# Altium footprint library SAMTEC SMD.PcbLib: 165 footprints (part 13 of 17)
Each footprint in its own frame and in the unit in brackets; x right, y up, seen from the top. Pads: shape width x height; smd on the part's side, far side on the other; paste and mask are expansions set on the pad; w line width, h text height; cw(c..) or ccw(c..) is an arc to the next point about the centre after c.
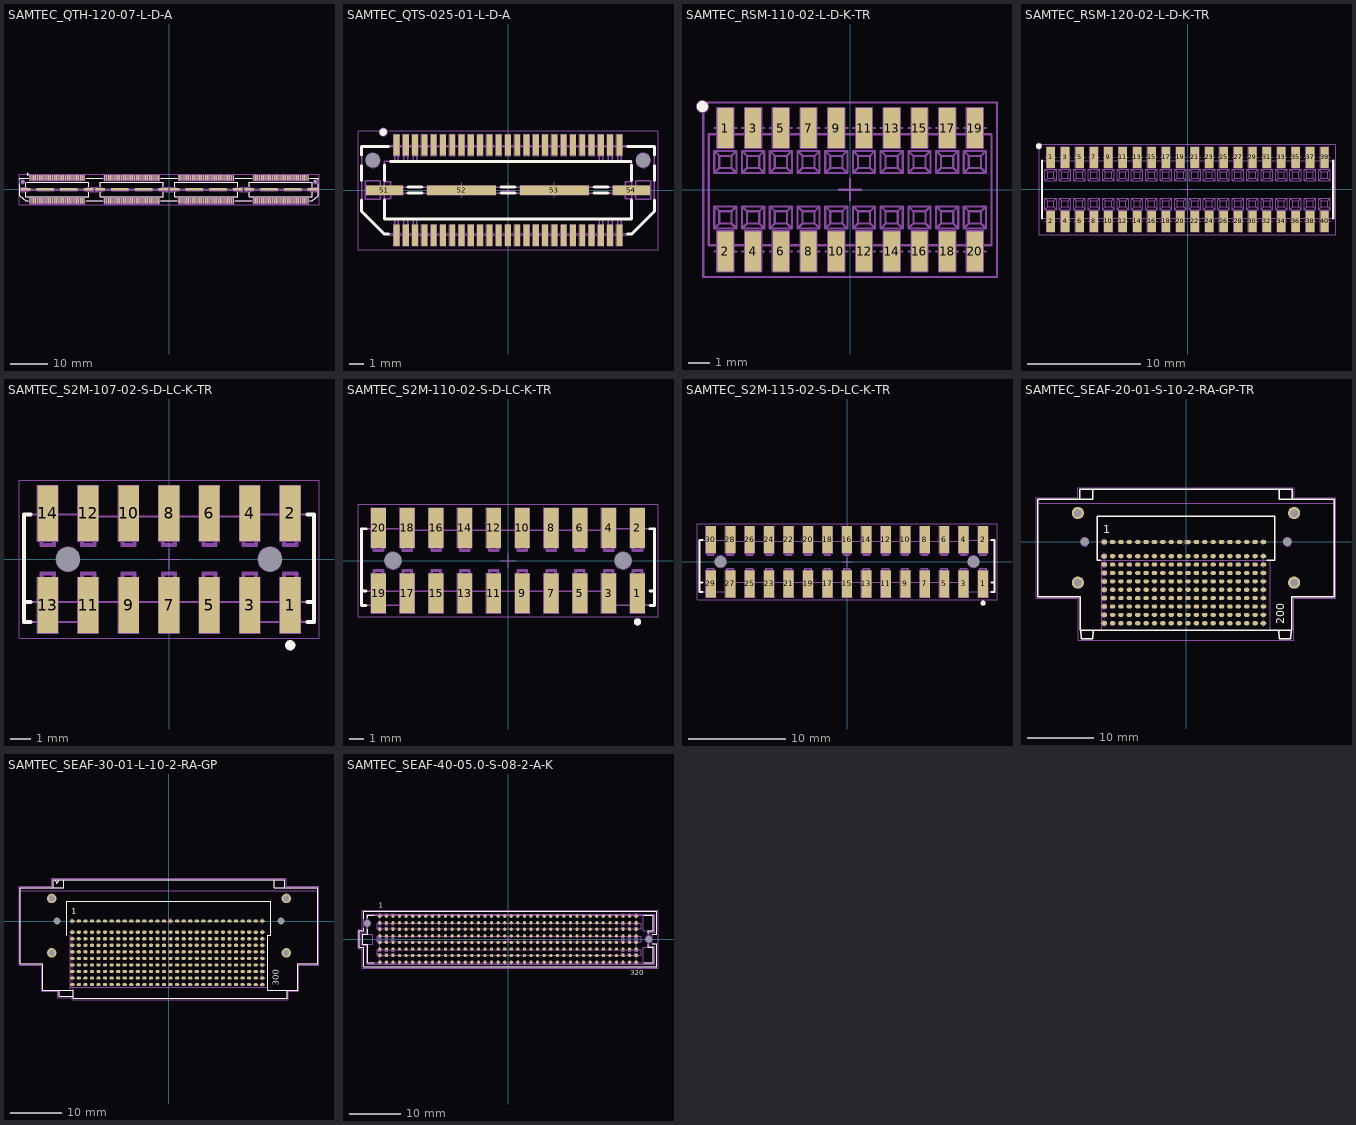
[diagram p12: the footprints below, top view; thin cyan lines are the x and y axes]

## SAMTEC_QTH-120-07-L-D-A [mm] "240  (4x60) Contacts, Pitch 0.5mm, Straight Double Row High Speed Ground Plane Header (Lead Style 24.24mm)"
height 24.24
pads (258):
  rect 0.305x1.45 smd mask+0: 1(-37.255,3.086) 2(-37.255,-3.086) 3(-36.755,3.086) 4(-36.755,-3.086) 5(-36.255,3.086) 6(-36.255,-3.086) 7(-35.755,3.086) 8(-35.755,-3.086) 9(-35.255,3.086) 10(-35.255,-3.086) 11(-34.755,3.086) 12(-34.755,-3.086) 13(-34.255,3.086) 14(-34.255,-3.086) 15(-33.755,3.086) 16(-33.755,-3.086) 17(-33.255,3.086) 18(-33.255,-3.086) 19(-32.755,3.086) 20(-32.755,-3.086) 21(-32.255,3.086) 22(-32.255,-3.086) 23(-31.755,3.086) 24(-31.755,-3.086) 25(-31.255,3.086) 26(-31.255,-3.086) 27(-30.755,3.086) 28(-30.755,-3.086) 29(-30.255,3.086) 30(-30.255,-3.086) 31(-29.755,3.086) 32(-29.755,-3.086) 33(-29.255,3.086) 34(-29.255,-3.086) 35(-28.755,3.086) 36(-28.755,-3.086) 37(-28.255,3.086) 38(-28.255,-3.086) 39(-27.755,3.086) 40(-27.755,-3.086) 41(-27.255,3.086) 42(-27.255,-3.086) 43(-26.755,3.086) 44(-26.755,-3.086) 45(-26.255,3.086) 46(-26.255,-3.086) 47(-25.755,3.086) 48(-25.755,-3.086) 49(-25.255,3.086) 50(-25.255,-3.086) 51(-24.755,3.086) 52(-24.755,-3.086) 53(-24.255,3.086) 54(-24.255,-3.086) 55(-23.755,3.086) 56(-23.755,-3.086) 57(-23.255,3.086) 58(-23.255,-3.086) 59(-22.755,3.086) 60(-22.755,-3.086) 61(-17.252,3.086) 62(-17.252,-3.086) 63(-16.752,3.086) 64(-16.752,-3.086) 65(-16.252,3.086) 66(-16.252,-3.086) 67(-15.752,3.086) 68(-15.752,-3.086) 69(-15.252,3.086) 70(-15.252,-3.086) 71(-14.752,3.086) 72(-14.752,-3.086) 73(-14.252,3.086) 74(-14.252,-3.086) 75(-13.752,3.086) 76(-13.752,-3.086) 77(-13.252,3.086) 78(-13.252,-3.086) 79(-12.752,3.086) 80(-12.752,-3.086) 81(-12.252,3.086) 82(-12.252,-3.086) 83(-11.752,3.086) 84(-11.752,-3.086) 85(-11.252,3.086) 86(-11.252,-3.086) 87(-10.752,3.086) 88(-10.752,-3.086) 89(-10.252,3.086) 90(-10.252,-3.086) 91(-9.752,3.086) 92(-9.752,-3.086) 93(-9.252,3.086) 94(-9.252,-3.086) 95(-8.752,3.086) 96(-8.752,-3.086) 97(-8.252,3.086) 98(-8.252,-3.086) 99(-7.752,3.086) 100(-7.752,-3.086) 101(-7.252,3.086) 102(-7.252,-3.086) 103(-6.752,3.086) 104(-6.752,-3.086) 105(-6.252,3.086) 106(-6.252,-3.086) 107(-5.752,3.086) 108(-5.752,-3.086) 109(-5.252,3.086) 110(-5.252,-3.086) 111(-4.752,3.086) 112(-4.752,-3.086) 113(-4.252,3.086) 114(-4.252,-3.086) 115(-3.752,3.086) 116(-3.752,-3.086) 117(-3.252,3.086) 118(-3.252,-3.086) 119(-2.752,3.086) 120(-2.752,-3.086) 121(2.752,3.086) 122(2.752,-3.086) 123(3.251,3.086) 124(3.251,-3.086) 125(3.751,3.086) 126(3.751,-3.086) 127(4.252,3.086) 128(4.252,-3.086) 129(4.751,3.086) 130(4.751,-3.086) 131(5.252,3.086) 132(5.252,-3.086) 133(5.751,3.086) 134(5.751,-3.086) 135(6.251,3.086) 136(6.251,-3.086) 137(6.752,3.086) 138(6.752,-3.086) 139(7.251,3.086) 140(7.251,-3.086) 141(7.752,3.086) 142(7.752,-3.086) 143(8.251,3.086) 144(8.251,-3.086) 145(8.751,3.086) 146(8.751,-3.086) 147(9.252,3.086) 148(9.252,-3.086) 149(9.751,3.086) 150(9.751,-3.086) 151(10.252,3.086) 152(10.252,-3.086) 153(10.751,3.086) 154(10.751,-3.086) 155(11.251,3.086) 156(11.251,-3.086) 157(11.752,3.086) 158(11.752,-3.086) 159(12.251,3.086) 160(12.251,-3.086) 161(12.751,3.086) 162(12.751,-3.086) 163(13.252,3.086) 164(13.252,-3.086) 165(13.751,3.086) 166(13.751,-3.086) 167(14.252,3.086) 168(14.252,-3.086) 169(14.751,3.086) 170(14.751,-3.086) 171(15.251,3.086) 172(15.251,-3.086) 173(15.752,3.086) 174(15.752,-3.086) 175(16.251,3.086) 176(16.251,-3.086) 177(16.751,3.086) 178(16.751,-3.086) 179(17.252,3.086) 180(17.252,-3.086) 181(22.755,3.086) 182(22.755,-3.086) 183(23.255,3.086) 184(23.255,-3.086) 185(23.755,3.086) 186(23.755,-3.086) 187(24.255,3.086) 188(24.255,-3.086) 189(24.755,3.086) 190(24.755,-3.086) 191(25.255,3.086) 192(25.255,-3.086) 193(25.755,3.086) 194(25.755,-3.086) 195(26.255,3.086) 196(26.255,-3.086) 197(26.755,3.086) 198(26.755,-3.086) 199(27.255,3.086) 200(27.255,-3.086) 201(27.755,3.086) 202(27.755,-3.086) 203(28.255,3.086) 204(28.255,-3.086) 205(28.755,3.086) 206(28.755,-3.086) 207(29.255,3.086) 208(29.255,-3.086) 209(29.755,3.086) 210(29.755,-3.086) 211(30.255,3.086) 212(30.255,-3.086) 213(30.755,3.086) 214(30.755,-3.086) 215(31.255,3.086) 216(31.255,-3.086) 217(31.755,3.086) 218(31.755,-3.086) 219(32.255,3.086) 220(32.255,-3.086) 221(32.755,3.086) 222(32.755,-3.086) 223(33.255,3.086) 224(33.255,-3.086) 225(33.755,3.086) 226(33.755,-3.086) 227(34.255,3.086) 228(34.255,-3.086) 229(34.755,3.086) 230(34.755,-3.086) 231(35.255,3.086) 232(35.255,-3.086) 233(35.755,3.086) 234(35.755,-3.086) 235(36.255,3.086) 236(36.255,-3.086) 237(36.755,3.086) 238(36.755,-3.086) 239(37.255,3.086) 240(37.255,-3.086)
  rect 2.54x0.64 smd mask+0: 241(-38.45,0) 244(-21.56,0) 245(-18.447,0) 248(-1.557,0) 249(1.557,0) 252(18.447,0) 253(21.56,0) 256(38.45,0)
  rect 4.7x0.64 smd mask+0: 242(-33.18,0) 243(-26.83,0) 246(-13.177,0) 247(-6.827,0) 250(6.827,0) 251(13.177,0) 254(26.83,0) 255(33.18,0)
  round 0.5 hole 1 unplated mask+0.25: 257(-39.245,2.032) 258(39.245,2.032)
Top Overlay:
  circle w0.25: c-37.897,4.047 r0.125
  lines w0.2: -39.977,1.509 -39.977,-1.639 -38.454,-2.982 -37.807,-2.982 ; -39.977,2.555 -39.977,2.982 -37.807,2.982 ; -38.424,-0.72 -38.424,-1.967 -21.543,-1.967 -21.543,-0.72 ; -38.424,0.72 -38.424,1.664 ; -38.347,1.967 -21.543,1.967 -21.543,0.72 ; -22.202,-2.982 -17.804,-2.982 ; -22.202,2.982 -17.804,2.982 ; -18.437,-0.72 -18.437,-1.967 -1.556,-1.967 -1.556,-0.72 ; -18.437,0.72 -18.437,1.967 -1.556,1.967 -1.556,0.72 ; -2.199,-2.982 2.199,-2.982 ; -2.199,2.982 2.199,2.982 ; 1.551,-0.72 1.551,-1.967 18.431,-1.967 18.431,-0.72 ; 1.551,0.72 1.551,1.967 18.431,1.967 18.431,0.72 ; 17.804,-2.982 22.202,-2.982 ; 17.804,2.982 22.202,2.982 ; 21.538,-0.72 21.538,-1.967 38.419,-1.967 38.419,-0.72 ; 21.538,0.72 21.538,1.967 38.347,1.967 ; 37.807,-2.982 38.449,-2.982 39.972,-1.639 39.972,1.502 ; 37.807,2.982 39.972,2.982 39.972,2.562 ; 38.419,0.72 38.419,1.675
Mechanical 8:
  drawing of 1550 lines, arcs and shapes, not listed
Mechanical 14:
  circle w0.1: c-37.895,4.047 r0.25
  lines w0.1: -38.708,-0.19 -39.438,-0.19 -39.438,0.19 -38.708,0.19 ; -38.424,-0.571 -38.008,-0.571 -38.008,-0.193 -38.159,-0.193 -38.159,0.193 -38.008,0.193 -38.008,0.571 -38.424,0.571 ; -21.543,-0.571 -21.959,-0.571 -21.959,-0.193 -21.808,-0.193 -21.808,0.193 -21.959,0.193 -21.959,0.571 -21.543,0.571 ; -21.069,-0.19 -20.529,-0.19 -20.529,0.19 -21.069,0.19 ; -18.911,-0.19 -19.451,-0.19 -19.451,0.19 -18.911,0.19 ; -18.437,-0.571 -18.02,-0.571 -18.02,-0.193 -18.171,-0.193 -18.171,0.193 -18.02,0.193 -18.02,0.571 -18.437,0.571 ; -1.556,-0.571 -1.972,-0.571 -1.972,-0.193 -1.821,-0.193 -1.821,0.193 -1.972,0.193 -1.972,0.571 -1.556,0.571 ; -1.081,-0.19 -0.542,-0.19 -0.542,0.19 -1.081,0.19 ; 1.076,-0.19 0.537,-0.19 0.537,0.19 1.076,0.19 ; 1.551,-0.571 1.967,-0.571 1.967,-0.193 1.816,-0.193 1.816,0.193 1.967,0.193 1.967,0.571 1.551,0.571 ; 18.431,-0.571 18.015,-0.571 18.015,-0.193 18.166,-0.193 18.166,0.193 18.015,0.193 18.015,0.571 18.431,0.571 ; 18.906,-0.19 19.445,-0.19 19.445,0.19 18.906,0.19 ; 21.063,-0.19 20.524,-0.19 20.524,0.19 21.063,0.19 ; 21.538,-0.571 21.954,-0.571 21.954,-0.193 21.803,-0.193 21.803,0.193 21.954,0.193 21.954,0.571 21.538,0.571 ; 38.419,-0.571 38.003,-0.571 38.003,-0.193 38.154,-0.193 38.154,0.193 38.003,0.193 38.003,0.571 38.419,0.571 ; 38.703,-0.19 39.433,-0.19 39.433,0.19 38.703,0.19 ; -39.977,-1.639 -38.454,-2.982 38.449,-2.982 39.972,-1.639 39.972,2.982 -39.977,2.982 -39.977,-1.639 ; -39.723,-0.635 -38.708,-0.635 -38.708,0.631 -39.723,0.631 -39.723,-0.635 ; -38.424,-1.967 -21.543,-1.967 -21.543,1.967 -38.424,1.967 -38.424,-1.967 ; -38.156,-0.19 -21.811,-0.19 -21.811,0.19 -38.156,0.19 -38.156,-0.19 ; -21.069,-0.635 -18.911,-0.635 -18.911,0.635 -21.069,0.635 -21.069,-0.635 ; -18.437,-1.967 -1.556,-1.967 -1.556,1.967 -18.437,1.967 -18.437,-1.967 ; -18.169,-0.19 -1.824,-0.19 -1.824,0.19 -18.169,0.19 -18.169,-0.19 ; -1.081,-0.635 1.076,-0.635 1.076,0.635 -1.081,0.635 -1.081,-0.635 ; 1.551,-1.967 18.431,-1.967 18.431,1.967 1.551,1.967 1.551,-1.967 ; 1.819,-0.19 18.164,-0.19 18.164,0.19 1.819,0.19 1.819,-0.19 ; 18.906,-0.635 18.906,0.635 21.063,0.635 21.063,-0.635 18.906,-0.635 ; 21.538,-1.967 38.419,-1.967 38.419,1.967 21.538,1.967 21.538,-1.967 ; 21.806,-0.19 38.151,-0.19 38.151,0.19 21.806,0.19 21.806,-0.19 ; 38.703,-0.635 39.718,-0.635 39.718,0.635 38.703,0.635 38.703,-0.635
Mechanical 15:
  lines w0.05: -40.227,-4.061 -40.227,4.061 40.222,4.061 40.222,-4.061 -40.227,-4.061
3D body "SAMTEC_QTH-120-07-L-D-A.stp": height 24.24, standoff -0.73, extent -39.977,-3.553 39.972,3.554

## SAMTEC_QTS-025-01-L-D-A [mm] "50 Contacts Female, Pitch 0.635mm, Straight Double Row High Speed Ground Plane Header"
height 4.27
pads (56):
  rect 0.4x1.45 smd mask+0: 1(-7.62,3.086) 2(-7.62,-3.086) 3(-6.985,3.086) 4(-6.985,-3.086) 5(-6.35,3.086) 6(-6.35,-3.086) 7(-5.715,3.086) 8(-5.715,-3.086) 9(-5.08,3.086) 10(-5.08,-3.086) 11(-4.445,3.086) 12(-4.445,-3.086) 13(-3.81,3.086) 14(-3.81,-3.086) 15(-3.175,3.086) 16(-3.175,-3.086) 17(-2.54,3.086) 18(-2.54,-3.086) 19(-1.905,3.086) 20(-1.905,-3.086) 21(-1.27,3.086) 22(-1.27,-3.086) 23(-0.635,3.086) 24(-0.635,-3.086) 25(0,3.086) 26(0,-3.086) 27(0.635,3.086) 28(0.635,-3.086) 29(1.27,3.086) 30(1.27,-3.086) 31(1.905,3.086) 32(1.905,-3.086) 33(2.54,3.086) 34(2.54,-3.086) 35(3.175,3.086) 36(3.175,-3.086) 37(3.81,3.086) 38(3.81,-3.086) 39(4.445,3.086) 40(4.445,-3.086) 41(5.08,3.086) 42(5.08,-3.086) 43(5.715,3.086) 44(5.715,-3.086) 45(6.35,3.086) 46(6.35,-3.086) 47(6.985,3.086) 48(6.985,-3.086) 49(7.62,3.086) 50(7.62,-3.086)
  rect 2.54x0.64 smd mask+0: 51(-8.446,0) 54(8.445,0)
  rect 4.7x0.64 smd mask+0: 52(-3.175,0) 53(3.175,0)
  round 0.5 hole 1 unplated mask+0.25: 55(-9.24,2.036) 56(9.24,2.036)
Top Overlay:
  circle w0.25: c-8.539,3.969 r0.125
  lines w0.2: -10.008,-0.667 -10.008,-1.46 -8.484,-2.984 -8.173,-2.984 ; -10.008,0.667 -10.008,1.669 ; -10.008,2.395 -10.008,2.984 -8.173,2.984 ; -8.446,-0.667 -8.446,-1.968 8.445,-1.968 8.445,-0.667 ; -8.446,0.667 -8.446,1.727 ; -8.041,1.968 8.392,1.954 ; -6.826,-0.203 -5.875,-0.203 ; -6.826,0.203 -5.875,0.203 ; -0.476,-0.203 0.475,-0.203 ; -0.476,0.203 0.475,0.203 ; 5.874,-0.203 6.826,-0.203 ; 5.874,0.203 6.826,0.203 ; 8.173,-2.984 8.483,-2.984 10.007,-1.46 10.007,-0.667 ; 8.173,2.984 10.007,2.984 10.007,2.395 ; 8.445,0.667 8.445,1.727 ; 10.007,0.667 10.007,1.669
Mechanical 8:
  drawing of 444 lines, arcs and shapes, not listed
Mechanical 14:
  circle w0.1: c-8.537,3.969 r0.25
  lines w0.1: -8.738,-0.191 -9.462,-0.191 -9.462,0.19 -8.738,0.19 ; -8.446,-0.572 -8.029,-0.572 -8.029,-0.203 ; -8.446,0.571 -8.029,0.571 -8.029,0.203 ; -7.747,-1.969 -7.747,-2.4 -7.493,-2.4 -7.493,-1.969 ; -7.747,1.968 -7.747,2.4 -7.493,2.4 -7.493,1.968 ; -7.722,-2.985 -7.722,-3.556 -7.519,-3.556 -7.519,-2.985 ; -7.722,2.984 -7.722,3.556 -7.519,3.556 -7.519,2.984 ; -7.112,-1.969 -7.112,-2.4 -6.858,-2.4 -6.858,-1.969 ; -7.112,1.968 -7.112,2.4 -6.858,2.4 -6.858,1.968 ; -7.087,-2.985 -7.087,-3.556 -6.884,-3.556 -6.884,-2.985 ; -7.087,2.984 -7.087,3.556 -6.884,3.556 -6.884,2.984 ; -6.477,-1.969 -6.477,-2.4 -6.223,-2.4 -6.223,-1.969 ; -6.477,1.968 -6.477,2.4 -6.223,2.4 -6.223,1.968 ; 6.223,-1.969 6.223,-2.4 6.477,-2.4 6.477,-1.969 ; 6.223,1.968 6.223,2.4 6.477,2.4 6.477,1.968 ; 6.858,-1.969 6.858,-2.4 7.112,-2.4 7.112,-1.969 ; 6.858,1.968 6.858,2.4 7.112,2.4 7.112,1.968 ; 6.883,-2.985 6.883,-3.556 7.086,-3.556 7.086,-2.985 ; 6.883,2.984 6.883,3.556 7.086,3.556 7.086,2.984 ; 7.493,-1.969 7.493,-2.4 7.747,-2.4 7.747,-1.969 ; 7.493,1.968 7.493,2.4 7.747,2.4 7.747,1.968 ; 7.518,-2.985 7.518,-3.556 7.721,-3.556 7.721,-2.985 ; 7.518,2.984 7.518,3.556 7.721,3.556 7.721,2.984 ; 8.029,-0.203 8.029,-0.572 8.445,-0.572 ; 8.445,0.571 8.029,0.571 8.029,0.203 ; 8.737,-0.191 9.461,-0.191 9.461,0.19 8.737,0.19 ; -8.029,0.203 8.029,0.203 ; -8.029,0.203 -8.156,0.203 -8.156,-0.203 8.156,-0.203 8.156,0.203 8.029,0.203 ; -10.008,-1.461 -8.484,-2.985 8.483,-2.985 10.007,-1.461 10.007,2.984 -10.008,2.984 -10.008,-1.461 ; -9.754,-0.635 -9.754,0.635 -8.738,0.635 -8.738,-0.635 -9.754,-0.635 ; -8.446,-1.969 8.445,-1.969 8.445,1.968 -8.446,1.968 -8.446,-1.969 ; 8.737,-0.635 8.737,0.635 9.753,0.635 9.753,-0.635 8.737,-0.635
Mechanical 15:
  lines w0.05: -10.258,-4.06 -8.073,-4.06 8.073,-4.06 10.257,-4.06 10.257,4.06 8.073,4.06 -8.073,4.06 -10.258,4.06 -10.258,-4.06
3D body "SAMTEC_QTS-025-01-L-D-A.stp": height 4.27, standoff -0.75, extent -10.008,-3.556 10.007,3.556

## SAMTEC_RSM-110-02-L-D-K-TR [mm] "20 Contacts - Pitch 1.27mm - Dual Row Straight SMD Micro Socket"
height 6.1
pads (20):
  rect 0.74x1.84 smd: 1(-5.715,2.825) 2(-5.715,-2.825) 3(-4.445,2.825) 4(-4.445,-2.825) 5(-3.175,2.825) 6(-3.175,-2.825) 7(-1.905,2.825) 8(-1.905,-2.825) 9(-0.635,2.825) 10(-0.635,-2.825) 11(0.635,2.825) 12(0.635,-2.825) 13(1.905,2.825) 14(1.905,-2.825) 15(3.175,2.825) 16(3.175,-2.825) 17(4.445,2.825) 18(4.445,-2.825) 19(5.715,2.825) 20(5.715,-2.825)
Top Overlay:
  circle w0.25: c-6.767,3.811 r0.125
  circle w0.25: c-6.767,3.811 r0.125
Mechanical 8:
  drawing of 214 lines, arcs and shapes, not listed
Mechanical 14:
  drawing of 245 lines, arcs and shapes, not listed
Mechanical 15:
  lines w0.1: -6.727,-3.995 -6.727,3.995 6.727,3.995 6.727,-3.995 -6.727,-3.995
3D body "SAMTEC_RSM-110-02-L-D-K-TR.stp": height 6.07, standoff 0, extent -6.477,-3.232 6.477,3.232

## SAMTEC_RSM-120-02-L-D-K-TR [mm] "40 Contacts - Pitch 1.27mm - Dual Row Straight SMD Micro Socket"
height 6.1
pads (40):
  rect 0.74x1.84 smd: 1(-12.065,2.825) 2(-12.065,-2.825) 3(-10.795,2.825) 4(-10.795,-2.825) 5(-9.525,2.825) 6(-9.525,-2.825) 7(-8.255,2.825) 8(-8.255,-2.825) 9(-6.985,2.825) 10(-6.985,-2.825) 11(-5.715,2.825) 12(-5.715,-2.825) 13(-4.445,2.825) 14(-4.445,-2.825) 15(-3.175,2.825) 16(-3.175,-2.825) 17(-1.905,2.825) 18(-1.905,-2.825) 19(-0.635,2.825) 20(-0.635,-2.825) 21(0.635,2.825) 22(0.635,-2.825) 23(1.905,2.825) 24(1.905,-2.825) 25(3.175,2.825) 26(3.175,-2.825) 27(4.445,2.825) 28(4.445,-2.825) 29(5.715,2.825) 30(5.715,-2.825) 31(6.985,2.825) 32(6.985,-2.825) 33(8.255,2.825) 34(8.255,-2.825) 35(9.525,2.825) 36(9.525,-2.825) 37(10.795,2.825) 38(10.795,-2.825) 39(12.065,2.825) 40(12.065,-2.825)
Top Overlay:
  circle w0.25: c-13.117,3.811 r0.125
  circle w0.25: c-13.117,3.811 r0.125
  lines w0.2: -12.827,-2.54 -12.827,2.54 ; 12.827,-2.54 12.827,2.54
Mechanical 8:
  drawing of 324 lines, arcs and shapes, not listed
Mechanical 14:
  drawing of 485 lines, arcs and shapes, not listed
Mechanical 15:
  lines w0.05: -13.077,-3.995 13.077,-3.995 13.077,3.995 -13.077,3.995 -13.077,-3.995
3D body "SAMTEC_RSM-120-02-L-D-K-TR.stp": height 6.07, standoff 0, extent -12.827,-3.232 12.827,3.232

## SAMTEC_S2M-107-02-S-D-LC-K-TR [mm] "14 Contacts, Pitch 2mm, Dual Row Surface Mount Tiger Eye High-reliability Cable Socket"
height 4.65
pads (16):
  rect 1.02x2.77 smd: 1(6,-2.275) 2(6,2.275) 3(4,-2.275) 4(4,2.275) 5(2,-2.275) 6(2,2.275) 7(0,-2.275) 8(0,2.275) 9(-2,-2.275) 10(-2,2.275) 11(-4,-2.275) 12(-4,2.275) 13(-6,-2.275) 14(-6,2.275)
  round 0.5 hole 1.2 unplated mask+0.35: MEC1(-5,0) MEC2(5,0)
Top Overlay:
  circle w0.25: c6,-4.26 r0.125
  lines w0.2: -7.175,-2.125 -6.86,-2.125 ; -6.86,-3.115 -7.175,-3.115 -7.175,2.215 -6.86,2.215 ; 6.86,-3.115 7.175,-3.115 7.175,2.215 6.86,2.215 ; 6.86,-2.125 7.175,-2.125
Mechanical 8:
  circle w0.05: c-5,0 r0.6
  circle w0.05: c5,0 r0.6
  lines w0.05: -5.5,0 -5,0 ; -5,-0.5 -5,0 ; -5,0.5 -5,0 ; -4.5,0 -5,0 ; -0.5,0 0,0 ; 0,-0.5 0,0 ; 0,0.5 0,0 ; 0.5,0 0,0 ; 4.5,0 5,0 ; 5,-0.5 5,0 ; 5,0.5 5,0 ; 5.5,0 5,0 ; -6.51,-3.66 -6.51,-0.89 -5.49,-0.89 -5.49,-3.66 ; -6.51,-3.66 -5.49,-3.66 ; -6.51,-3.66 -6,-2.275 -5.49,-3.66 ; -6.51,3.66 -5.49,3.66 ; -6.51,3.66 -6.51,0.89 -5.49,0.89 -5.49,3.66 ; -6.51,3.66 -6,2.275 -5.49,3.66 ; -4.51,-3.66 -4.51,-0.89 -3.49,-0.89 -3.49,-3.66 ; -4.51,-3.66 -3.49,-3.66 ; -4.51,-3.66 -4,-2.275 -3.49,-3.66 ; -4.51,3.66 -4.51,0.89 -3.49,0.89 -3.49,3.66 ; -4.51,3.66 -3.49,3.66 ; -4.51,3.66 -4,2.275 -3.49,3.66 ; -2.51,-3.66 -2.51,-0.89 -1.49,-0.89 -1.49,-3.66 ; -2.51,-3.66 -1.49,-3.66 ; -2.51,-3.66 -2,-2.275 -1.49,-3.66 ; -2.51,3.66 -2.51,0.89 -1.49,0.89 -1.49,3.66 ; -2.51,3.66 -1.49,3.66 ; -2.51,3.66 -2,2.275 -1.49,3.66 ; -0.51,-3.66 -0.51,-0.89 0.51,-0.89 0.51,-3.66 ; -0.51,-3.66 0.51,-3.66 ; -0.51,-3.66 0,-2.275 0.51,-3.66 ; -0.51,3.66 -0.51,0.89 0.51,0.89 0.51,3.66 ; -0.51,3.66 0.51,3.66 ; -0.51,3.66 0,2.275 0.51,3.66 ; 1.49,-3.66 1.49,-0.89 2.51,-0.89 2.51,-3.66 ; 1.49,-3.66 2.51,-3.66 ; 1.49,-3.66 2,-2.275 2.51,-3.66 ; 1.49,3.66 1.49,0.89 2.51,0.89 2.51,3.66 ; 1.49,3.66 2.51,3.66 ; 1.49,3.66 2,2.275 2.51,3.66 ; 3.49,-3.66 3.49,-0.89 4.51,-0.89 4.51,-3.66 ; 3.49,-3.66 4.51,-3.66 ; 3.49,-3.66 4,-2.275 4.51,-3.66 ; 3.49,3.66 3.49,0.89 4.51,0.89 4.51,3.66 ; 3.49,3.66 4.51,3.66 ; 3.49,3.66 4,2.275 4.51,3.66 ; 5.49,-3.66 5.49,-0.89 6.51,-0.89 6.51,-3.66 ; 5.49,-3.66 6.51,-3.66 ; 5.49,-3.66 6,-2.275 6.51,-3.66 ; 5.49,3.66 5.49,0.89 6.51,0.89 6.51,3.66 ; 5.49,3.66 6.51,3.66 ; 5.49,3.66 6,2.275 6.51,3.66
Mechanical 14:
  drawing of 171 lines, arcs and shapes, not listed
Mechanical 15:
  lines w0.05: -7.425,-3.91 7.425,-3.91 7.425,3.91 -7.425,3.91 -7.425,-3.91
3D body "SAMTEC_S2M-107-02-S-D-LC-K-TR.stp": height 4.65, standoff -1.39, extent -7.175,-3.15 7.175,3.15

## SAMTEC_S2M-110-02-S-D-LC-K-TR [mm] "20 Contacts, Pitch 2mm, Dual Row Surface Mount Tiger Eye High-reliability Cable Socket"
height 4.65
pads (22):
  rect 1.02x2.77 smd: 1(9,-2.275) 2(9,2.275) 3(7,-2.275) 4(7,2.275) 5(5,-2.275) 6(5,2.275) 7(3,-2.275) 8(3,2.275) 9(1,-2.275) 10(1,2.275) 11(-1,-2.275) 12(-1,2.275) 13(-3,-2.275) 14(-3,2.275) 15(-5,-2.275) 16(-5,2.275) 17(-7,-2.275) 18(-7,2.275) 19(-9,-2.275) 20(-9,2.275)
  round 0.5 hole 1.2 unplated mask+0.35: MEC1(-8,0) MEC2(8,0)
Top Overlay:
  circle w0.25: c9,-4.26 r0.125
  lines w0.2: -10.175,-2.125 -9.86,-2.125 ; -9.86,-3.115 -10.175,-3.115 -10.175,2.215 -9.86,2.215 ; 9.86,-3.115 10.175,-3.115 10.175,2.215 9.86,2.215 ; 9.86,-2.125 10.175,-2.125
Mechanical 8:
  circle w0.05: c8,0 r0.6
  circle w0.05: c-8,0 r0.6
  lines w0.05: -8.5,0 -8,0 ; -8,-0.5 -8,0 ; -8,0.5 -8,0 ; -7.5,0 -8,0 ; -0.5,0 0,0 ; 0,-0.5 0,0 ; 0,0.5 0,0 ; 0.5,0 0,0 ; 7.5,0 8,0 ; 8,-0.5 8,0 ; 8,0.5 8,0 ; 8.5,0 8,0 ; -9.51,-3.66 -9,-2.275 -8.49,-3.66 ; -9.51,-3.66 -8.49,-3.66 ; -9.51,-3.66 -9.51,-0.89 -8.49,-0.89 -8.49,-3.66 ; -9.51,3.66 -9,2.275 -8.49,3.66 ; -9.51,3.66 -9.51,0.89 -8.49,0.89 -8.49,3.66 ; -9.51,3.66 -8.49,3.66 ; -7.51,-3.66 -7,-2.275 -6.49,-3.66 ; -7.51,-3.66 -6.49,-3.66 ; -7.51,-3.66 -7.51,-0.89 -6.49,-0.89 -6.49,-3.66 ; -7.51,3.66 -7,2.275 -6.49,3.66 ; -7.51,3.66 -6.49,3.66 ; -7.51,3.66 -7.51,0.89 -6.49,0.89 -6.49,3.66 ; -5.51,-3.66 -5,-2.275 -4.49,-3.66 ; -5.51,-3.66 -4.49,-3.66 ; -5.51,-3.66 -5.51,-0.89 -4.49,-0.89 -4.49,-3.66 ; -5.51,3.66 -5,2.275 -4.49,3.66 ; -5.51,3.66 -4.49,3.66 ; -5.51,3.66 -5.51,0.89 -4.49,0.89 -4.49,3.66 ; -3.51,-3.66 -3,-2.275 -2.49,-3.66 ; -3.51,-3.66 -2.49,-3.66 ; -3.51,-3.66 -3.51,-0.89 -2.49,-0.89 -2.49,-3.66 ; -3.51,3.66 -3,2.275 -2.49,3.66 ; -3.51,3.66 -2.49,3.66 ; -3.51,3.66 -3.51,0.89 -2.49,0.89 -2.49,3.66 ; -1.51,-3.66 -1,-2.275 -0.49,-3.66 ; -1.51,-3.66 -0.49,-3.66 ; -1.51,-3.66 -1.51,-0.89 -0.49,-0.89 -0.49,-3.66 ; -1.51,3.66 -1,2.275 -0.49,3.66 ; -1.51,3.66 -0.49,3.66 ; -1.51,3.66 -1.51,0.89 -0.49,0.89 -0.49,3.66 ; 0.49,-3.66 1,-2.275 1.51,-3.66 ; 0.49,-3.66 0.49,-0.89 1.51,-0.89 1.51,-3.66 ; 0.49,-3.66 1.51,-3.66 ; 0.49,3.66 1,2.275 1.51,3.66 ; 0.49,3.66 0.49,0.89 1.51,0.89 1.51,3.66 ; 0.49,3.66 1.51,3.66 ; 2.49,-3.66 3,-2.275 3.51,-3.66 ; 2.49,-3.66 2.49,-0.89 3.51,-0.89 3.51,-3.66 ; 2.49,-3.66 3.51,-3.66 ; 2.49,3.66 3,2.275 3.51,3.66 ; 2.49,3.66 2.49,0.89 3.51,0.89 3.51,3.66 ; 2.49,3.66 3.51,3.66 ; 4.49,-3.66 5,-2.275 5.51,-3.66 ; 4.49,-3.66 4.49,-0.89 5.51,-0.89 5.51,-3.66 ; 4.49,-3.66 5.51,-3.66 ; 4.49,3.66 5,2.275 5.51,3.66 ; 4.49,3.66 4.49,0.89 5.51,0.89 5.51,3.66 ; 4.49,3.66 5.51,3.66 ; 6.49,-3.66 7,-2.275 7.51,-3.66 ; 6.49,-3.66 7.51,-3.66 ; 6.49,-3.66 6.49,-0.89 7.51,-0.89 7.51,-3.66 ; 6.49,3.66 7,2.275 7.51,3.66 ; 6.49,3.66 7.51,3.66 ; 6.49,3.66 6.49,0.89 7.51,0.89 7.51,3.66 ; 8.49,-3.66 9,-2.275 9.51,-3.66 ; 8.49,-3.66 9.51,-3.66 ; 8.49,-3.66 8.49,-0.89 9.51,-0.89 9.51,-3.66 ; 8.49,3.66 9,2.275 9.51,3.66 ; 8.49,3.66 9.51,3.66 ; 8.49,3.66 8.49,0.89 9.51,0.89 9.51,3.66
Mechanical 14:
  drawing of 237 lines, arcs and shapes, not listed
Mechanical 15:
  lines w0.05: -10.425,-3.91 -10.425,3.91 10.425,3.91 10.425,-3.91 -10.425,-3.91
3D body "SAMTEC_S2M-110-02-S-D-LC-K-TR.stp": height 4.65, standoff -1.39, extent -10.175,-3.15 10.175,3.15

## SAMTEC_S2M-115-02-S-D-LC-K-TR [mm] "30 Contacts, Pitch 2mm, Dual Row Surface Mount Tiger Eye High-reliability Cable Socket"
height 4.65
pads (32):
  rect 1.02x2.77 smd: 1(14,-2.275) 2(14,2.275) 3(12,-2.275) 4(12,2.275) 5(10,-2.275) 6(10,2.275) 7(8,-2.275) 8(8,2.275) 9(6,-2.275) 10(6,2.275) 11(4,-2.275) 12(4,2.275) 13(2,-2.275) 14(2,2.275) 15(0,-2.275) 16(0,2.275) 17(-2,-2.275) 18(-2,2.275) 19(-4,-2.275) 20(-4,2.275) 21(-6,-2.275) 22(-6,2.275) 23(-8,-2.275) 24(-8,2.275) 25(-10,-2.275) 26(-10,2.275) 27(-12,-2.275) 28(-12,2.275) 29(-14,-2.275) 30(-14,2.275)
  round 0.5 hole 1.2 unplated mask+0.35: MEC1(-13,0) MEC2(13,0)
Top Overlay:
  circle w0.25: c14,-4.26 r0.125
  lines w0.2: -15.175,-2.125 -14.86,-2.125 ; -14.86,-3.115 -15.175,-3.115 -15.175,2.215 -14.86,2.215 ; 14.86,-3.115 15.175,-3.115 15.175,2.215 14.86,2.215 ; 14.86,-2.125 15.175,-2.125
Mechanical 8:
  drawing of 194 lines, arcs and shapes, not listed
Mechanical 14:
  drawing of 347 lines, arcs and shapes, not listed
Mechanical 15:
  lines w0.05: -15.425,-3.91 15.425,-3.91 15.425,3.91 -15.425,3.91 -15.425,-3.91
3D body "SAMTEC_S2M-115-02-S-D-LC-K-TR.stp": height 4.65, standoff -1.39, extent -15.175,-3.15 15.175,3.15

## SAMTEC_SEAF-20-01-S-10-2-RA-GP-TR [mm] "200 Contacts in 10 rows (20 Pin per Row), Hi-Density Right Angle Open Pin Field Connector (Guide Post Option)"
height 15.53
pads (206):
  oval 0.84x0.63 smd paste+0.1: 1(-12.395,0) 2(-12.395,-2.159) 3(-12.395,-3.429) 4(-12.395,-4.699) 5(-12.395,-5.969) 6(-12.395,-7.239) 7(-12.395,-8.509) 8(-12.395,-9.779) 9(-12.395,-11.049) 10(-12.395,-12.319) 11(-11.125,0) 12(-11.125,-2.159) 13(-11.125,-3.429) 14(-11.125,-4.699) 15(-11.125,-5.969) 16(-11.125,-7.239) 17(-11.125,-8.509) 18(-11.125,-9.779) 19(-11.125,-11.049) 20(-11.125,-12.319) 21(-9.855,0) 22(-9.855,-2.159) 23(-9.855,-3.429) 24(-9.855,-4.699) 25(-9.855,-5.969) 26(-9.855,-7.239) 27(-9.855,-8.509) 28(-9.855,-9.779) 29(-9.855,-11.049) 30(-9.855,-12.319) 31(-8.585,0) 32(-8.585,-2.159) 33(-8.585,-3.429) 34(-8.585,-4.699) 35(-8.585,-5.969) 36(-8.585,-7.239) 37(-8.585,-8.509) 38(-8.585,-9.779) 39(-8.585,-11.049) 40(-8.585,-12.319) 41(-7.315,0) 42(-7.315,-2.159) 43(-7.315,-3.429) 44(-7.315,-4.699) 45(-7.315,-5.969) 46(-7.315,-7.239) 47(-7.315,-8.509) 48(-7.315,-9.779) 49(-7.315,-11.049) 50(-7.315,-12.319) 51(-6.045,0) 52(-6.045,-2.159) 53(-6.045,-3.429) 54(-6.045,-4.699) 55(-6.045,-5.969) 56(-6.045,-7.239) 57(-6.045,-8.509) 58(-6.045,-9.779) 59(-6.045,-11.049) 60(-6.045,-12.319) 61(-4.775,0) 62(-4.775,-2.159) 63(-4.775,-3.429) 64(-4.775,-4.699) 65(-4.775,-5.969) 66(-4.775,-7.239) 67(-4.775,-8.509) 68(-4.775,-9.779) 69(-4.775,-11.049) 70(-4.775,-12.319) 71(-3.505,0) 72(-3.505,-2.159) 73(-3.505,-3.429) 74(-3.505,-4.699) 75(-3.505,-5.969) 76(-3.505,-7.239) 77(-3.505,-8.509) 78(-3.505,-9.779) 79(-3.505,-11.049) 80(-3.505,-12.319) 81(-2.235,0) 82(-2.235,-2.159) 83(-2.235,-3.429) 84(-2.235,-4.699) 85(-2.235,-5.969) 86(-2.235,-7.239) 87(-2.235,-8.509) 88(-2.235,-9.779) 89(-2.235,-11.049) 90(-2.235,-12.319) 91(-0.965,0) 92(-0.965,-2.159) 93(-0.965,-3.429) 94(-0.965,-4.699) 95(-0.965,-5.969) 96(-0.965,-7.239) 97(-0.965,-8.509) 98(-0.965,-9.779) 99(-0.965,-11.049) 100(-0.965,-12.319) 101(0.305,0) 102(0.305,-2.159) 103(0.305,-3.429) 104(0.305,-4.699) 105(0.305,-5.969) 106(0.305,-7.239) 107(0.305,-8.509) 108(0.305,-9.779) 109(0.305,-11.049) 110(0.305,-12.319) 111(1.575,0) 112(1.575,-2.159) 113(1.575,-3.429) 114(1.575,-4.699) 115(1.575,-5.969) 116(1.575,-7.239) 117(1.575,-8.509) 118(1.575,-9.779) 119(1.575,-11.049) 120(1.575,-12.319) 121(2.845,0) 122(2.845,-2.159) 123(2.845,-3.429) 124(2.845,-4.699) 125(2.845,-5.969) 126(2.845,-7.239) 127(2.845,-8.509) 128(2.845,-9.779) 129(2.845,-11.049) 130(2.845,-12.319) 131(4.115,0) 132(4.115,-2.159) 133(4.115,-3.429) 134(4.115,-4.699) 135(4.115,-5.969) 136(4.115,-7.239) 137(4.115,-8.509) 138(4.115,-9.779) 139(4.115,-11.049) 140(4.115,-12.319) 141(5.385,0) 142(5.385,-2.159) 143(5.385,-3.429) 144(5.385,-4.699) 145(5.385,-5.969) 146(5.385,-7.239) 147(5.385,-8.509) 148(5.385,-9.779) 149(5.385,-11.049) 150(5.385,-12.319) 151(6.655,0) 152(6.655,-2.159) 153(6.655,-3.429) 154(6.655,-4.699) 155(6.655,-5.969) 156(6.655,-7.239) 157(6.655,-8.509) 158(6.655,-9.779) 159(6.655,-11.049) 160(6.655,-12.319) 161(7.925,0) 162(7.925,-2.159) 163(7.925,-3.429) 164(7.925,-4.699) 165(7.925,-5.969) 166(7.925,-7.239) 167(7.925,-8.509) 168(7.925,-9.779) 169(7.925,-11.049) 170(7.925,-12.319) 171(9.195,0) 172(9.195,-2.159) 173(9.195,-3.429) 174(9.195,-4.699) 175(9.195,-5.969) 176(9.195,-7.239) 177(9.195,-8.509) 178(9.195,-9.779) 179(9.195,-11.049) 180(9.195,-12.319) 181(10.465,0) 182(10.465,-2.159) 183(10.465,-3.429) 184(10.465,-4.699) 185(10.465,-5.969) 186(10.465,-7.239) 187(10.465,-8.509) 188(10.465,-9.779) 189(10.465,-11.049) 190(10.465,-12.319) 191(11.735,0) 192(11.735,-2.159) 193(11.735,-3.429) 194(11.735,-4.699) 195(11.735,-5.969) 196(11.735,-7.239) 197(11.735,-8.509) 198(11.735,-9.779) 199(11.735,-11.049) 200(11.735,-12.319)